# Altium footprint library 04.连接器件.pcb.PCBLIB: 363 footprints (part 17 of 23)
Each footprint in its own frame and in the unit in brackets; x right, y up, seen from the top. Pads: shape width x height; smd on the part's side, far side on the other; paste and mask are expansions set on the pad; w line width, h text height; cw(c..) or ccw(c..) is an arc to the next point about the centre after c.
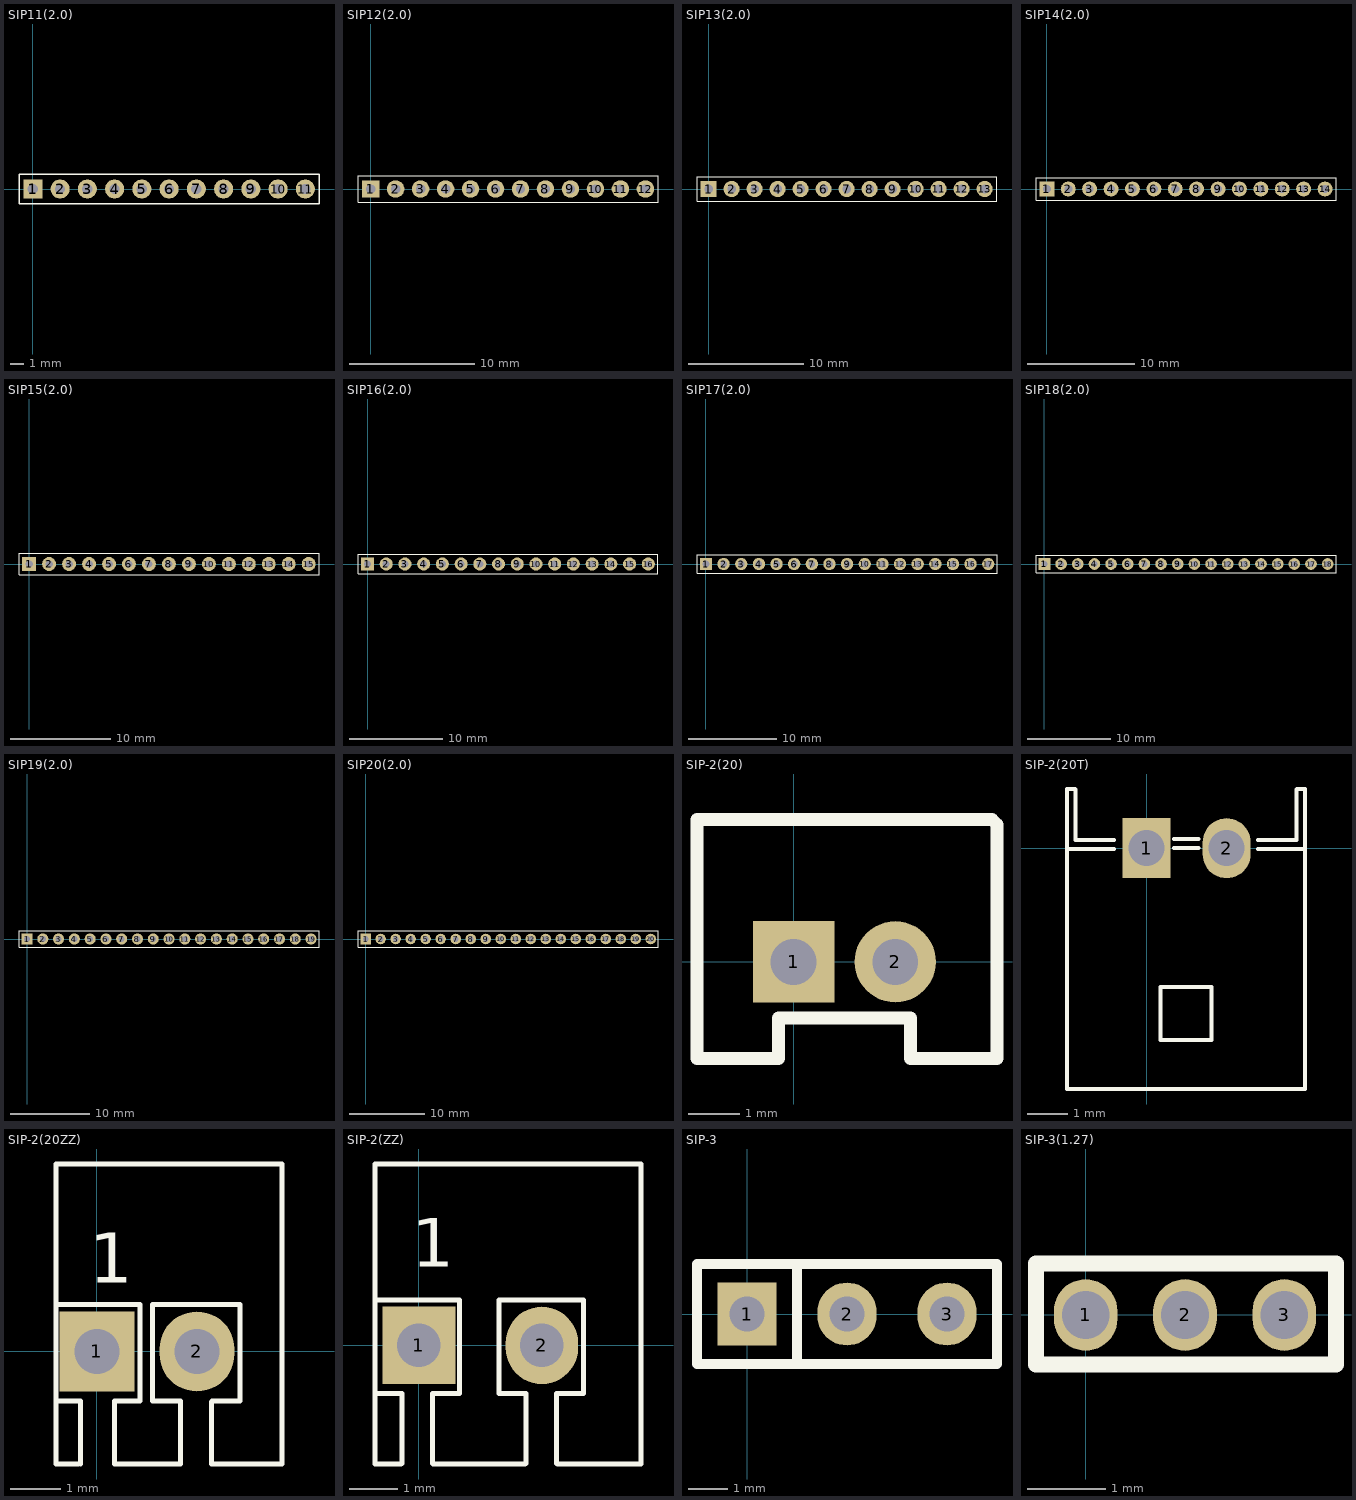
[diagram p16: the footprints below, top view; thin cyan lines are the x and y axes]

## SIP11(2.0) [mm] "单排针"
pads (11):
  rect 1.4x1.4 hole 0.75: 1(0,0)
  round 1.4 hole 0.75: 2(2,0) 3(4,0) 4(6,0) 5(8,0) 6(10,0) 7(12,0) 8(14,0) 9(16,0) 10(18,0) 11(20,0)
TopOverlay:
  lines w0.1: -1.016,-1.067 -1.016,1.067 21.006,1.067 21.006,-1.067 -1.016,-1.067
3D body "SIP11(2.0)排针.": height 8, standoff -2.6, extent -0.994,-1.016 21.006,0.984

## SIP12(2.0) [mm] "单排针"
pads (12):
  rect 1.4x1.4 hole 0.75: 1(0,0)
  round 1.4 hole 0.75: 2(2,0) 3(4,0) 4(6,0) 5(8,0) 6(10,0) 7(12,0) 8(14,0) 9(16,0) 10(18,0) 11(20,0) 12(22,0)
TopOverlay:
  lines w0.1: -1.016,-1.067 -1.016,1.067 23.012,1.067 23.012,-1.067 -1.016,-1.067
3D body "SIP12(2.0)排针.": height 8, standoff -2.6, extent -0.991,-1.016 23.009,0.984

## SIP13(2.0) [mm] "单排针"
pads (13):
  rect 1.4x1.4 hole 0.75: 1(0,0)
  round 1.4 hole 0.75: 2(2,0) 3(4,0) 4(6,0) 5(8,0) 6(10,0) 7(12,0) 8(14,0) 9(16,0) 10(18,0) 11(20,0) 12(22,0) 13(24,0)
TopOverlay:
  lines w0.1: -1.016,-1.067 25.07,-1.067 25.07,1.067 -1.016,1.067 -1.016,-1.067
3D body "SIP13(2.0)排针.": height 8, standoff -2.6, extent -0.991,-1.016 25.009,0.984

## SIP14(2.0) [mm] "单排针"
pads (14):
  rect 1.4x1.4 hole 0.75: 1(0,0)
  round 1.4 hole 0.75: 2(2,0) 3(4,0) 4(6,0) 5(8,0) 6(10,0) 7(12,0) 8(14,0) 9(16,0) 10(18,0) 11(20,0) 12(22,0) 13(24,0) 14(26,0)
TopOverlay:
  lines w0.1: -1.016,-1.067 27.026,-1.067 27.026,1.067 -1.016,1.067 -1.016,-1.067
3D body "SIP14(2.0)排针.": height 8, standoff -2.6, extent -0.991,-1.016 27.009,0.984

## SIP15(2.0) [mm] "单排针"
pads (15):
  rect 1.4x1.4 hole 0.75: 1(0,0)
  round 1.4 hole 0.75: 2(2,0) 3(4,0) 4(6,0) 5(8,0) 6(10,0) 7(12,0) 8(14,0) 9(16,0) 10(18,0) 11(20,0) 12(22,0) 13(24,0) 14(26,0) 15(28,0)
TopOverlay:
  lines w0.1: -1.016,-1.067 29.032,-1.067 29.032,1.067 -1.016,1.067 -1.016,-1.067
3D body "SIP15(2.0)排针.": height 8, standoff -2.6, extent -0.991,-0.991 29.009,1.009

## SIP16(2.0) [mm] "单排针"
pads (16):
  rect 1.4x1.4 hole 0.75: 1(0,0)
  round 1.4 hole 0.75: 2(2,0) 3(4,0) 4(6,0) 5(8,0) 6(10,0) 7(12,0) 8(14,0) 9(16,0) 10(18,0) 11(20,0) 12(22,0) 13(24,0) 14(26,0) 15(28,0) 16(30,0)
TopOverlay:
  lines w0.1: -1.016,-1.067 31.039,-1.067 31.039,1.067 -1.016,1.067 -1.016,-1.067
3D body "SIP16(2.0)排针.": height 8, standoff -2.6, extent -0.991,-1.016 31.009,0.984

## SIP17(2.0) [mm] "单排针"
pads (17):
  rect 1.4x1.4 hole 0.75: 1(0,0)
  round 1.4 hole 0.75: 2(2,0) 3(4,0) 4(6,0) 5(8,0) 6(10,0) 7(12,0) 8(14,0) 9(16,0) 10(18,0) 11(20,0) 12(22,0) 13(24,0) 14(26,0) 15(28,0) 16(30,0) 17(32,0)
TopOverlay:
  lines w0.1: -1.016,-1.067 -1.016,1.067 32.995,1.067 32.995,-1.067 -1.016,-1.067
3D body "SIP17(2.0)排针.": height 8, standoff -2.6, extent -0.991,-0.991 33.009,1.009

## SIP18(2.0) [mm] "单排针"
pads (18):
  rect 1.4x1.4 hole 0.75: 1(0,0)
  round 1.4 hole 0.75: 2(2,0) 3(4,0) 4(6,0) 5(8,0) 6(10,0) 7(12,0) 8(14,0) 9(16,0) 10(18,0) 11(20,0) 12(22,0) 13(24,0) 14(26,0) 15(28,0) 16(30,0) 17(32,0) 18(34,0)
TopOverlay:
  lines w0.1: -1.016,-1.067 -1.016,1.067 35.001,1.067 35.001,-1.067 -1.016,-1.067
3D body "SIP18(2.0)排针.": height 8, standoff -2.6, extent -0.965,-0.991 35.035,1.009

## SIP19(2.0) [mm] "单排针"
pads (19):
  rect 1.4x1.4 hole 0.75: 1(0,0)
  round 1.4 hole 0.75: 2(2,0) 3(4,0) 4(6,0) 5(8,0) 6(10,0) 7(12,0) 8(14,0) 9(16,0) 10(18,0) 11(20,0) 12(22,0) 13(24,0) 14(26,0) 15(28,0) 16(30,0) 17(32,0) 18(34,0) 19(36,0)
TopOverlay:
  lines w0.1: -1.016,-1.067 -1.016,1.067 37.008,1.067 37.008,-1.067 -1.016,-1.067
3D body "SIP19(2.0)排针.": height 8, standoff -2.6, extent -1.016,-1.016 36.984,0.984

## SIP20(2.0) [mm] "单排针"
pads (20):
  rect 1.4x1.4 hole 0.75: 1(0,0)
  round 1.4 hole 0.75: 2(2,0) 3(4,0) 4(6,0) 5(8,0) 6(10,0) 7(12,0) 8(14,0) 9(16,0) 10(18,0) 11(20,0) 12(22,0) 13(24,0) 14(26,0) 15(28,0) 16(30,0) 17(32,0) 18(34,0) 19(36,0) 20(38,0)
TopOverlay:
  lines w0.1: -1.016,-1.067 -1.016,1.067 38.964,1.067 38.964,-1.067 -1.016,-1.067
3D body "SIP20(2.0)排针.": height 8, standoff -2.6, extent -1.016,-0.984 38.984,1.016

## SIP-2(20) [mm]
pads (2):
  rect 1.6x1.6 hole 0.9: 1(0,0)
  round 1.6 hole 0.9: 2(2,0)
TopOverlay:
  lines w0.254: -1.9,2.8 -1.9,-1.9 -0.3,-1.9 -0.3,-1.1 2.3,-1.1 2.3,-1.9 4,-1.9 ; -1.9,2.8 -1.9,2.8 ; -1.9,2.8 3.9,2.8 4,2.7 4,-1.9 ; 4,-1.9 4,-1.9

## SIP-2(20T) [mm]
pads (2):
  rect 1.2x1.5 hole 0.9: 1(0,0)
  oval 1.2x1.5 hole 0.9: 2(2,0)
TopOverlay:
  lines w0.1: -1.992,-0.02 -0.818,-0.02 ; -0.813,0.203 -1.778,0.203 -1.778,1.473 -1.785,1.48 -1.992,1.48 -1.992,-6.02 1.036,-6.02 ; 0.686,0 1.295,0 ; 0.686,0.229 1.295,0.229 ; 0.934,-6.02 3.962,-6.02 3.962,1.48 3.755,1.48 3.748,1.473 3.748,0.203 2.783,0.203 ; 0.934,-4.795 1.62,-4.795 1.62,-3.474 0.934,-3.474 ; 1.036,-4.795 0.35,-4.795 0.35,-3.474 1.036,-3.474 ; 2.788,-0.02 3.962,-0.02

## SIP-2(20ZZ) [mm]
pads (2):
  rect 1.5x1.6 hole 0.9: 1(0,0)
  oval 1.5x1.6 hole 0.9: 2(2,0)
TopOverlay:
  lines w0.1: -0.819,-2.25 -0.819,0.94 -0.819,3.75 3.7,3.75 3.7,-2.25 2.289,-2.25 2.289,-1.005 ; -0.8,-2.25 -0.377,-2.25 -0.362,-2.235 ; -0.8,-0.991 -0.33,-0.991 -0.33,-2.25 ; -0.8,0.94 0.857,0.94 0.857,-0.991 0.349,-0.991 0.349,-2.25 1.67,-2.25 1.67,-0.991 1.111,-0.991 1.111,0.94 2.864,0.94 2.864,-0.991 2.305,-0.991
  text "1" at -0.152,1.372 h1

## SIP-2(ZZ) [mm]
pads (2):
  rect 1.5x1.6 hole 0.9: 1(0,0)
  oval 1.5x1.6 hole 0.9: 2(2.54,0)
TopOverlay:
  lines w0.1: -0.91,-0.991 -0.351,-0.991 -0.351,-2.436 -0.365,-2.45 -0.91,-2.45 -0.91,0.94 ; 0.838,0.935 0.838,-0.991 0.279,-0.991 0.279,-2.436 0.293,-2.45 0.838,-2.45 1.651,-2.45 2.196,-2.45 2.21,-2.436 2.21,-0.991 1.651,-0.991 1.651,0.94 3.404,0.94 3.404,-0.991 2.845,-0.991 2.845,-2.436 2.859,-2.45 3.404,-2.45 4.59,-2.45 4.59,3.75 -0.91,3.75 -0.91,0.94 ; 0.843,0.94 -0.91,0.94
  text "1" at -0.152,1.626 h1

## SIP-3 [mm]
pads (3):
  rect 1.5x1.6 hole 0.9: 1(0,0)
  oval 1.5x1.6 hole 0.9: 2(2.54,0) 3(5.08,0)
TopOverlay:
  lines w0.254: 1.27,-1.27 1.27,1.27 ; -1.27,-1.27 -1.27,1.27 6.35,1.27 6.35,-1.27 -1.27,-1.27

## SIP-3(1.27) [mil]
pads (3):
  oval 32x36 hole 24: 1(0,0) 2(50,0) 3(100,0)
TopOverlay:
  lines w8: -25,-25 126,-25 ; -25,-24 -25,26 126,26 126,-24